# Altium footprint library Custom_Library.PcbLib: 221 footprints (part 12 of 14)
Each footprint in its own frame and in the unit in brackets; x right, y up, seen from the top. Pads: shape width x height; smd on the part's side, far side on the other; paste and mask are expansions set on the pad; w line width, h text height; cw(c..) or ccw(c..) is an arc to the next point about the centre after c.
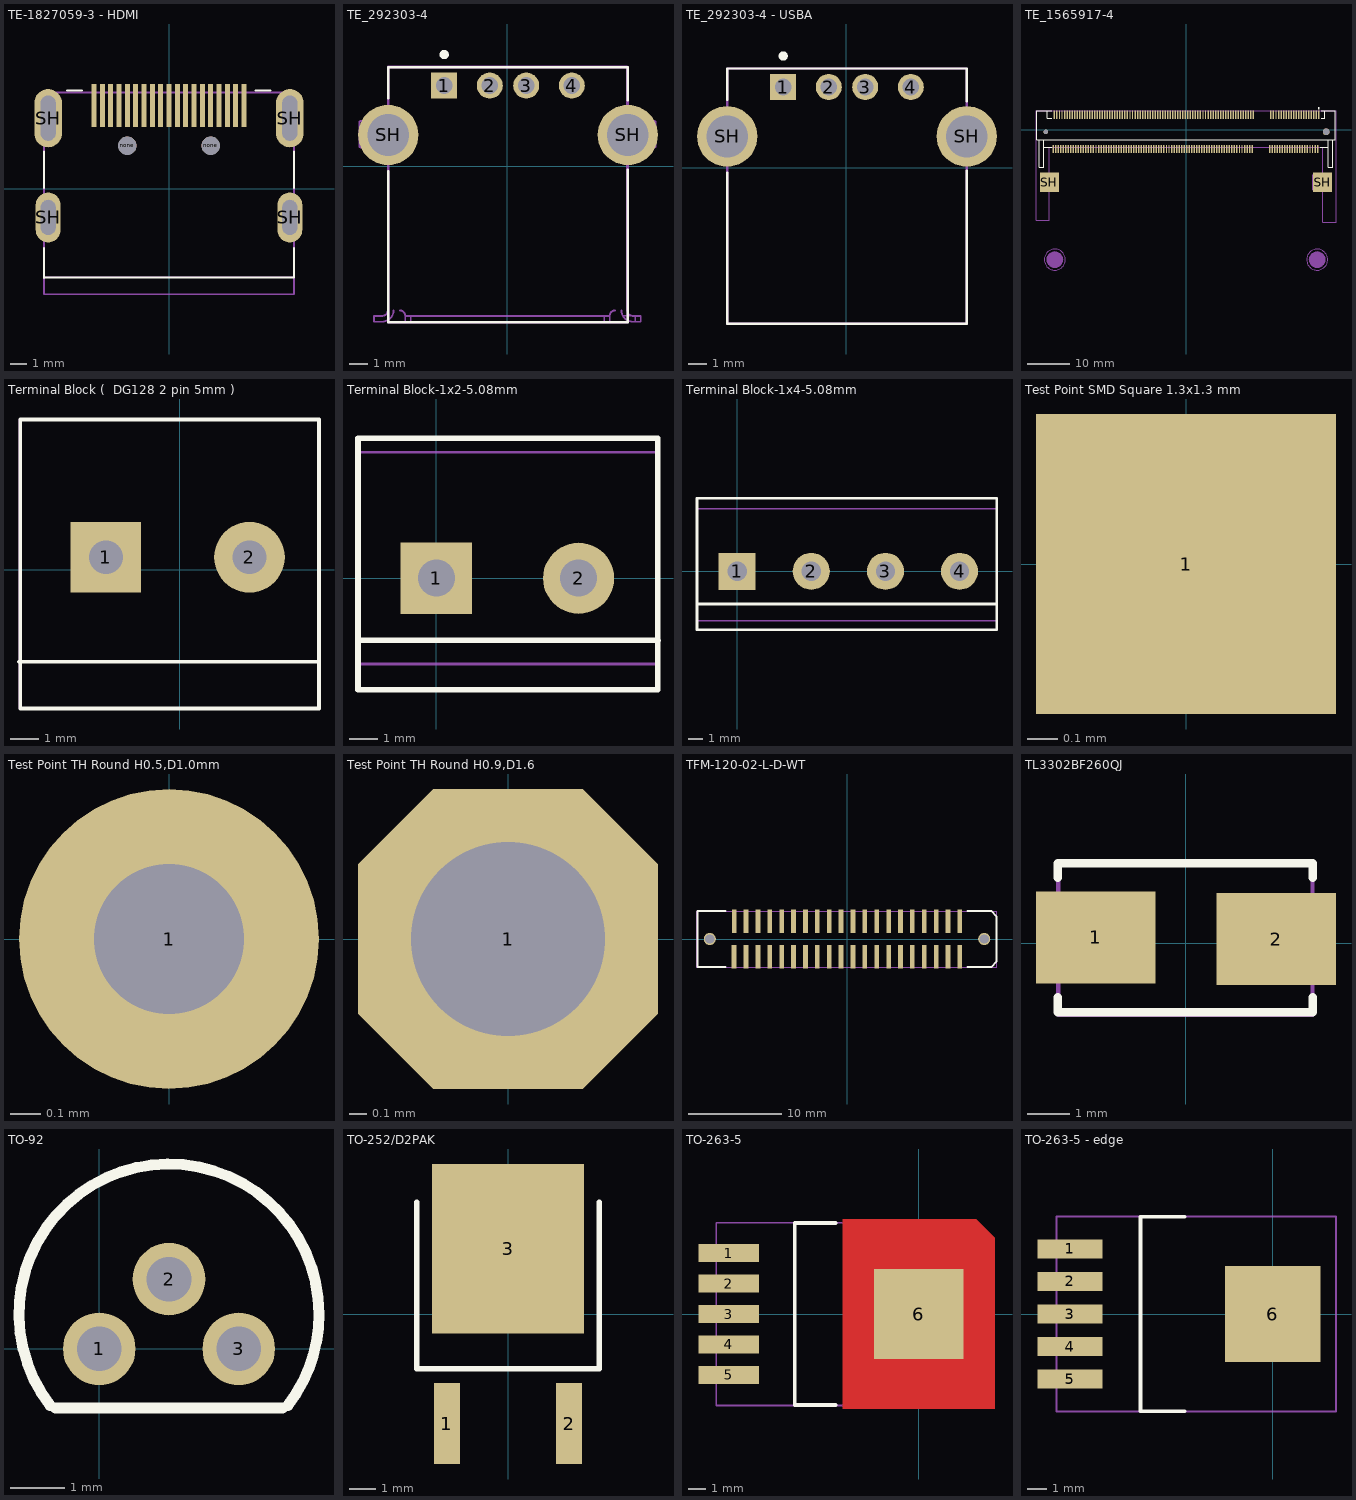
[diagram p11: the footprints below, top view; thin cyan lines are the x and y axes]

## TE-1827059-3 - HDMI [mm]
pads (25):
  rect 0.3x2.6 smd: 1(4.5,5) 2(4,5) 3(3.5,5) 4(3,5) 5(2.5,5) 6(2,5) 7(1.5,5) 8(1,5) 9(0.5,5) 10(0,5) 11(-0.5,5) 12(-1,5) 13(-1.5,5) 14(-2,5) 15(-2.5,5) 16(-3,5) 17(-3.5,5) 18(-4,5) 19(-4.5,5)
  round 1.1 hole 1.1 unplated: none(-2.5,2.59) none(2.5,2.59)
  oval 1.5x3 hole 0.9 slot 2.1 at 90 deg: SH(-7.25,-1.72) SH(7.25,-1.72)
  oval 1.65x3.5 hole 0.9 slot 2.7 at 90 deg: SH(-7.25,4.24) SH(7.25,4.24)
Top Overlay:
  lines w0.127: -7.5,-5.334 -7.5,-3.55 ; -7.5,0.05 -7.5,2.25 ; -7.493,-5.334 7.493,-5.31 ; -6.122,5.9 -5.222,5.9 ; 5.191,5.9 6.091,5.9 ; 7.5,-5.31 7.5,-3.55 ; 7.5,0.05 7.5,2.25
Top Assembly:
  lines w0.1: -7.5,-5.31 7.5,-5.31 ; -7.5,-5.31 -7.5,2.25 -7.5,5.776 5.066,5.776 7.5,5.776 7.5,-5.31 ; -7.5,-5.31 -7.5,-6.322 0.31,-6.322 7.5,-6.322 7.5,-5.31
  text "'.Designator'" at -3.49,-8.17 h1.27
3D body "1827059-3.STEP": height 6.08, standoff -2.2, extent -7.504,-6.321 7.497,5.779

## TE_292303-4 [mm]
pads (6):
  rect 1.428x1.428 hole 0.92: 1(-3.461,4.43)
  round 1.428 hole 0.92: 2(-0.961,4.43) 3(1.039,4.43) 4(3.539,4.43)
  round 3.316 hole 2.3: SH(-6.531,1.72) SH(6.609,1.72)
Top Overlay:
  circle w0.3: c-3.461,6.13 r0.1
  lines w0.127: -6.526,-0.27 -6.526,-8.56 6.604,-8.56 6.604,-0.17 ; -6.526,3.73 -6.526,5.44 6.604,5.44 6.604,3.63
Top Assembly:
  drawing of 5157 lines, arcs and shapes, not listed
  text "'.Designator'" at -3.765,-9.92 h1.27
Mechanical 13:
  lines w0.127: -6.526,-8.56 -6.526,5.44 6.604,5.44 6.604,-8.56 -6.526,-8.56
3D body "292303-4.STEP": height 7.77, standoff -3.59, extent -8.078,-8.56 8.156,5.44

## TE_292303-4 - USBA [mm]
pads (6):
  rect 1.428x1.428 hole 0.92: 1(-3.461,4.43)
  round 1.428 hole 0.92: 2(-0.961,4.43) 3(1.039,4.43) 4(3.539,4.43)
  round 3.316 hole 2.3: SH(-6.531,1.72) SH(6.609,1.72)
Top Overlay:
  circle w0.3: c-3.461,6.13 r0.1
  lines w0.127: -6.526,-0.27 -6.526,-8.56 6.604,-8.56 6.604,-0.17 ; -6.526,3.73 -6.526,5.44 6.604,5.44 6.604,3.63
Top Assembly:
  lines w0.1: -6.526,-8.56 6.604,-8.56 6.604,5.44 -6.526,5.44 -6.526,-8.56
  text "'.Designator'" at -3.765,-9.92 h1.27
Mechanical 13:
  lines w0.127: -6.526,-8.56 6.604,-8.56 6.604,5.44 -6.526,5.44 -6.526,-8.56
3D body "292303-4.STEP": height 7.77, standoff -3.59, extent -8.078,-8.56 8.156,5.44

## TE_1565917-4 [mm]
pads (206):
  rect 0.35x2 smd: 1(31.65,3.588) 2(31.35,-4.612) 3(31.05,3.588) 4(30.75,-4.612) 5(30.45,3.588) 6(30.15,-4.612) 7(29.85,3.588) 8(29.55,-4.612) 9(29.25,3.588) 10(28.95,-4.612) 11(28.65,3.588) 12(28.35,-4.612) 13(28.05,3.588) 14(27.75,-4.612) 15(27.45,3.588) 16(27.15,-4.612) 17(26.85,3.588) 18(26.55,-4.612) 19(26.25,3.588) 20(25.95,-4.612) 21(25.65,3.588) 22(25.35,-4.612) 23(25.05,3.588) 24(24.75,-4.612) 25(24.45,3.588) 26(24.15,-4.612) 27(23.85,3.588) 28(23.55,-4.612) 29(23.25,3.588) 30(22.95,-4.612) 31(22.65,3.588) 32(22.35,-4.612) 33(22.05,3.588) 34(21.75,-4.612) 35(21.45,3.588) 36(21.15,-4.612) 37(20.85,3.588) 38(20.55,-4.612) 39(20.25,3.588) 40(19.95,-4.612) 41(16.05,3.588) 42(15.75,-4.612) 43(15.45,3.588) 44(15.15,-4.612) 45(14.85,3.588) 46(14.55,-4.612) 47(14.25,3.588) 48(13.95,-4.612) 49(13.65,3.588) 50(13.35,-4.612) 51(13.05,3.588) 52(12.75,-4.612) 53(12.45,3.588) 54(12.15,-4.612) 55(11.85,3.588) 56(11.55,-4.612) 57(11.25,3.588) 58(10.95,-4.612) 59(10.65,3.588) 60(10.35,-4.612) 61(10.05,3.588) 62(9.75,-4.612) 63(9.45,3.588) 64(9.15,-4.612) 65(8.85,3.588) 66(8.55,-4.612) 67(8.25,3.588) 68(7.95,-4.612) 69(7.65,3.588) 70(7.35,-4.612) 71(7.05,3.588) 72(6.75,-4.612) 73(6.45,3.588) 74(6.15,-4.612) 75(5.85,3.588) 76(5.55,-4.612) 77(5.25,3.588) 78(4.95,-4.612) 79(4.65,3.588) 80(4.35,-4.612) 81(4.05,3.588) 82(3.75,-4.612) 83(3.45,3.588) 84(3.15,-4.612) 85(2.85,3.588) 86(2.55,-4.612) 87(2.25,3.588) 88(1.95,-4.612) 89(1.65,3.588) 90(1.35,-4.612) 91(1.05,3.588) 92(0.75,-4.612) 93(0.45,3.588) 94(0.15,-4.612) 95(-0.15,3.588) 96(-0.45,-4.612) 97(-0.75,3.588) 98(-1.05,-4.612) 99(-1.35,3.588) 100(-1.65,-4.612) 101(-1.95,3.588) 102(-2.25,-4.612) 103(-2.55,3.588) 104(-2.85,-4.612) 105(-3.15,3.588) 106(-3.45,-4.612) 107(-3.75,3.588) 108(-4.05,-4.612) 109(-4.35,3.588) 110(-4.65,-4.612) 111(-4.95,3.588) 112(-5.25,-4.612) 113(-5.55,3.588) 114(-5.85,-4.612) 115(-6.15,3.588) 116(-6.45,-4.612) 117(-6.75,3.588) 118(-7.05,-4.612) 119(-7.35,3.588) 120(-7.65,-4.612) 121(-7.95,3.588) 122(-8.25,-4.612) 123(-8.55,3.588) 124(-8.85,-4.612) 125(-9.15,3.588) 126(-9.45,-4.612) 127(-9.75,3.588) 128(-10.05,-4.612) 129(-10.35,3.588) 130(-10.65,-4.612) 131(-10.95,3.588) 132(-11.25,-4.612) 133(-11.55,3.588) 134(-11.85,-4.612) 135(-12.15,3.588) 136(-12.45,-4.612) 137(-12.75,3.588) 138(-13.05,-4.612) 139(-13.35,3.588) 140(-13.65,-4.612) 141(-13.95,3.588) 142(-14.25,-4.612) 143(-14.55,3.588) 144(-14.85,-4.612) 145(-15.15,3.588) 146(-15.45,-4.612) 147(-15.75,3.588) 148(-16.05,-4.612) 149(-16.35,3.588) 150(-16.65,-4.612) 151(-16.95,3.588) 152(-17.25,-4.612) 153(-17.55,3.588) 154(-17.85,-4.612) 155(-18.15,3.588) 156(-18.45,-4.612) 157(-18.75,3.588) 158(-19.05,-4.612) 159(-19.35,3.588) 160(-19.65,-4.612) 161(-19.95,3.588) 162(-20.25,-4.612) 163(-20.55,3.588) 164(-20.85,-4.612) 165(-21.15,3.588) 166(-21.45,-4.612) 167(-21.75,3.588) 168(-22.05,-4.612) 169(-22.35,3.588) 170(-22.65,-4.612) 171(-22.95,3.588) 172(-23.25,-4.612) 173(-23.55,3.588) 174(-23.85,-4.612) 175(-24.15,3.588) 176(-24.45,-4.612) 177(-24.75,3.588) 178(-25.05,-4.612) 179(-25.35,3.588) 180(-25.65,-4.612) 181(-25.95,3.588) 182(-26.25,-4.612) 183(-26.55,3.588) 184(-26.85,-4.612) 185(-27.15,3.588) 186(-27.45,-4.612) 187(-27.75,3.588) 188(-28.05,-4.612) 189(-28.35,3.588) 190(-28.65,-4.612) 191(-28.95,3.588) 192(-29.25,-4.612) 193(-29.55,3.588) 194(-29.85,-4.612) 195(-30.15,3.588) 196(-30.45,-4.612) 197(-30.75,3.588) 198(-31.05,-4.612) 199(-31.35,3.588) 200(-31.65,-4.612)
  round 4.013 on Mech7: none(-31.26,-30.966) none(31.261,-30.966)
  rect 4.5x4.6 smd: SH(-32.55,-12.512) SH(32.55,-12.512)
  round 1.1 hole 1.1 unplated: ""(-33.4,-0.512)
  round 1.6 hole 1.6 unplated: ""(33.4,-0.512)
Top Overlay:
  circle w0.25: c31.636,5.096 r0.1
  lines w0.127: -33,4.488 -32,4.488 ; -32,-4.212 -33.95,-4.212 ; -32,2.758 -33.02,2.758 -33.02,4.488 -35.55,4.488 -35.55,-2.362 -35,-2.362 ; 32,-4.212 33.95,-4.212 ; 32.2,2.758 33.02,2.758 33.02,4.488 35.55,4.488 35.55,-2.362 35,-2.362 ; 32.2,4.488 33,4.488 ; -35,-2.362 -33.95,-2.362 ; -35,-2.362 -35,-8.962 -33.95,-8.962 -33.95,-4.212 ; -33.95,-4.212 -33.95,-2.362 ; -33.95,-2.362 33.95,-2.362 ; 33.95,-2.362 35,-2.362 ; 33.95,-2.362 33.95,-8.962 35,-8.962 35,-2.362
Top Assembly:
  lines w0.1: -32.6,-14.32 -30.274,-14.32 -30.274,-10.68 -32.6,-10.68 ; 32.59,-14.32 30.263,-14.32 30.263,-10.68 32.59,-10.68 ; 35.75,-12.518 35.75,-12.5 ; -35.75,-21.56 -35.75,-16.962 -35.75,4.488 35.352,4.488 35.75,4.488 35.75,-22.012 33.8,-22.012 32.6,-22.012 32.6,-19.851 32.6,-4.212 -32.6,-4.212 -32.6,-17.97 -32.6,-21.56 -32.71,-21.56 -35.75,-21.56
  text "'.Designator'" at -3.37,-0.672 h1.27
DXF:
  circle w0.013: c-31.26,-30.966 r2.5
  circle w0.013: c31.261,-30.966 r2.5
3D body "Sodimm200.STEP": height 5.25, standoff -0.65, extent -35.755,-21.562 35.745,4.488

## Terminal Block (  DG128 2 pin 5mm ) [mm]
height 1.2
pads (2):
  rect 2.5x2.5 hole 1.2: 1(-2.615,0.447)
  round 2.5 hole 1.2: 2(2.465,0.447)
Top Overlay:
  lines w0.127: -5.685,-3.243 4.904,-3.243 ; -5.64,-4.901 4.923,-4.901 4.923,5.318 -5.64,5.318 -5.64,-4.901
Top Assembly:
  lines w0.1: -5.645,-4.903 4.915,-4.903 4.915,5.317 -5.645,5.317 -5.645,-4.903
  text "'.Designator'" at -3.556,-2.667 h1.27
3D body "DG128-5.0-02.stp": height 14.4, standoff -3.2, extent -5.695,-4.94 4.905,5.26

## Terminal Block-1x2-5.08mm [mil]
height 0.51
pads (2):
  rect 100x100 hole 52: 1(0,0)
  round 100 hole 52: 2(200,0)
Top Overlay:
  lines w7.87: -108.18,-87.09 311.61,-87.54 ; -110.06,-157 311.52,-157 311.52,197 -110.06,197 -110.06,-157
Top Assembly:
  lines w3.94: -108.28,-120.64 -108.28,177.17 310.33,177.17 310.33,-120.64 -108.28,-120.64
  text "'.Designator'" at -38.27,93.82 h50
3D body "tb5p-2p_p5_l10_w7-6_h10.stp": height 398.03, standoff -157.09, extent -107.83,-123.14 309.49,176.07

## Terminal Block-1x4-5.08mm [mil]
height 0.51
pads (4):
  rect 100x100 hole 52: 1(0,0)
  round 100 hole 52: 2(200,0) 3(400,0) 4(600,0)
Top Overlay:
  lines w7.87: -107.99,-87.89 700.35,-87.89 ; -107.99,-157.6 700.35,-157.6 700.35,197 -107.99,197 -107.99,-157.6
Top Assembly:
  lines w3.94: -108.2,-133.86 701.01,-133.86 701.01,169.29 -108.2,169.29 -108.2,-133.86
  text "'.Designator'" at 162.41,96.36 h50
3D body "tb5p-2p_p5_l10_w7-6_h10.stp": height 398.03, standoff -157.09, extent 284.15,-133 701.47,166.21
3D body "tb5p-2p_p5_l10_w7-6_h10.stp": height 398.03, standoff -157.09, extent -108.53,-133 308.79,166.21

## Test Point SMD Square 1.3x1.3 mm [mm]
pads (1):
  rect 1x1 smd paste-1 mask+0.1: 1(0,0)

## Test Point TH Round H0.5,D1.0mm [mm]
pads (1):
  round 1 hole 0.5: 1(0,0)

## Test Point TH Round H0.9,D1.6 [mm]
pads (1):
  oct 1.7x1.7 hole 1.1: 1(0,0)

## TFM-120-02-L-D-WT [mm]
pads (42):
  rect 0.55x2.5 smd: 1(-12.065,-1.905)
  rect 0.5x2.5 smd: 2(-12.065,1.905) 3(-10.795,-1.905) 4(-10.795,1.905) 5(-9.525,-1.905) 6(-9.525,1.905) 7(-8.255,-1.905) 8(-8.255,1.905) 9(-6.985,-1.905) 10(-6.985,1.905) 11(-5.715,-1.905) 12(-5.715,1.905) 13(-4.445,-1.905) 14(-4.445,1.905) 15(-3.175,-1.905) 16(-3.175,1.905) 17(-1.905,-1.905) 18(-1.905,1.905) 19(-0.635,-1.905) 20(-0.635,1.905) 21(0.635,-1.905) 22(0.635,1.905) 23(1.905,-1.905) 24(1.905,1.905) 25(3.175,-1.905) 26(3.175,1.905) 27(4.445,-1.905) 28(4.445,1.905) 29(5.715,-1.905) 30(5.715,1.905) 31(6.985,-1.905) 32(6.985,1.905) 33(8.255,-1.905) 34(8.255,1.905) 35(9.525,-1.905) 36(9.525,1.905) 37(10.795,-1.905) 38(10.795,1.905) 39(12.065,-1.905) 40(12.065,1.905)
  round 1.3 hole 1: none(-14.665,-0.005) none(14.665,-0.005)
Top Overlay:
  lines w0.2: -13,-3 -16,-3 -16,3 -13,3 ; 12.9,-3 15.4,-3 16,-2.4 16,2.4 15.4,3 12.9,3
Top Assembly:
  lines w0.1: -16.039,-3 -16.039,2.953 13.456,2.953 16.035,2.953 16.035,-3 -16.039,-3
  text "'.Designator'" at -4.556,-0.451 h1.27
3D body "TFM-120-02-L-D-WT.stp": height 5.74, standoff -2.21, extent -16.042,-2.996 16.038,2.973

## TL3302BF260QJ [mm]
pads (2):
  rect 2.8x2.16 smd mask+0.102: 1(-2.12,0.14) 2(2.12,0.1)
Top Overlay:
  lines w0.2: -3.007,-1.265 -3.007,-1.615 2.97,-1.615 2.97,-1.265 ; -3.007,1.536 -3.007,1.886 2.97,1.886 2.97,1.536
Top Assembly:
  lines w0.1: -3,-1.68 -3,1.86 2.97,1.86 2.97,-1.68 -3,-1.68
  text "'.Designator'" at -3.26,-2.79 h1.27
3D body "asdasd.STEP": height 5.2, standoff 0, extent -3.38,-1.651 3.38,1.849

## TO-92 [mil]
pads (3):
  round 52 hole 32: 1(0,0) 2(50,50) 3(100,0)
Top Overlay:
  lines w7.87: -35.2,-40.55 cw(c50,25) 157.5,25 cw(c50,25) 135.2,-40.55 ; -31.24,-42.5 131.24,-42.5

## TO-252/D2PAK [mm]
pads (3):
  rect 0.97x3.02 smd mask+0.152: 1(-2.286,-4.09) 2(2.286,-4.09)
  rect 5.67x6.32 smd paste-4 mask+0.152: 3(0,2.44)
Top Overlay:
  lines w0.2: -3.4,4.176 -3.4,-2.044 3.4,-2.044 3.4,4.176
Top Paste:
  region: -0.55,3.87 -2.27,3.87 -2.27,5.23 -0.55,5.23
  region: -0.55,1.76 -2.27,1.76 -2.27,3.12 -0.55,3.12
  region: -0.55,-0.35 -2.27,-0.35 -2.27,1.01 -0.55,1.01
  region: 2.27,3.87 0.55,3.87 0.55,5.23 2.27,5.23
  region: 2.27,1.76 0.55,1.76 0.55,3.12 2.27,3.12
  region: 2.27,-0.35 0.55,-0.35 0.55,1.01 2.27,1.01
3D body "VS-12CWQ10FN-M3.stp": height 2.49, standoff 0.05, extent -3.366,-5.202 3.366,6.482

## TO-263-5 [mm]
pads (6):
  rect 3.4x1 smd paste-3 mask+0: 1(-10.6,3.4) 2(-10.6,1.7) 3(-10.6,0) 4(-10.6,-1.7) 5(-10.6,-3.4)
  rect 5x5 smd paste-6 mask+0: 6(0,0)
Top Layer:
  region: -4.249,5.3 3.201,5.3 4.251,4.25 4.251,-5.3 -4.249,-5.3
Top Overlay:
  lines w0.2: -4.62,-5.08 -6.905,-5.08 -6.905,5.08 -4.62,5.08
Top Paste:
  region: 4.25,-5.3 -4.25,-5.3 -4.25,5.3 3.2,5.3 4.25,4.25
  region: -8.95,-0.45 -12.25,-0.45 -12.25,0.45 -8.95,0.45
  region: -8.95,1.25 -12.25,1.25 -12.25,2.15 -8.95,2.15
  region: -8.95,2.95 -12.25,2.95 -12.25,3.85 -8.95,3.85
  region: -8.95,-2.15 -12.25,-2.15 -12.25,-1.25 -8.95,-1.25
  region: -8.95,-3.85 -12.25,-3.85 -12.25,-2.95 -8.95,-2.95
Top Solder:
  region: -8.83,-0.57 -12.37,-0.57 -12.37,0.57 -8.83,0.57
  region: -8.83,1.13 -12.37,1.13 -12.37,2.27 -8.83,2.27
  region: -8.83,2.83 -12.37,2.83 -12.37,3.97 -8.83,3.97
  region: -8.83,-2.27 -12.37,-2.27 -12.37,-1.13 -8.83,-1.13
  region: -8.83,-3.97 -12.37,-3.97 -12.37,-2.83 -8.83,-2.83
  region: 4.37,-5.42 -4.37,-5.42 -4.37,5.42 3.265,5.42 4.37,4.315
Top Assembly:
  lines w0.1: -11.3,-5.1 3.3,-5.1 3.3,5.1 3.3,5.095 -11.3,5.095 -11.3,-5.1
  text "'.Designator'" at -7.465,6.185 h1.27
3D body "NOPB.STEP": height 4.8, standoff 0, extent -11.249,-5.076 3.102,5.084

## TO-263-5 - edge [mm]
pads (6):
  rect 3.4x1 smd paste-3 mask+0: 1(-10.6,3.4) 2(-10.6,1.7) 3(-10.6,0) 4(-10.6,-1.7) 5(-10.6,-3.4)
  rect 5x5 smd paste-6 mask+0: 6(0,0)
Top Overlay:
  lines w0.2: -4.62,-5.08 -6.905,-5.08 -6.905,5.08 -4.62,5.08
Top Paste:
  region: -8.95,-3.85 -12.25,-3.85 -12.25,-2.95 -8.95,-2.95
  region: -8.95,-2.15 -12.25,-2.15 -12.25,-1.25 -8.95,-1.25
  region: -8.95,2.95 -12.25,2.95 -12.25,3.85 -8.95,3.85
  region: -8.95,1.25 -12.25,1.25 -12.25,2.15 -8.95,2.15
  region: -8.95,-0.45 -12.25,-0.45 -12.25,0.45 -8.95,0.45
Top Solder:
  region: -8.83,-3.97 -12.37,-3.97 -12.37,-2.83 -8.83,-2.83
  region: -8.83,-2.27 -12.37,-2.27 -12.37,-1.13 -8.83,-1.13
  region: -8.83,2.83 -12.37,2.83 -12.37,3.97 -8.83,3.97
  region: -8.83,1.13 -12.37,1.13 -12.37,2.27 -8.83,2.27
  region: -8.83,-0.57 -12.37,-0.57 -12.37,0.57 -8.83,0.57
Top Assembly:
  lines w0.1: -11.3,-5.1 -11.3,5.095 3.3,5.095 3.3,5.1 3.3,-5.1 -11.3,-5.1
  text "'.Designator'" at -7.465,6.185 h1.27
3D body "NOPB.STEP": height 4.8, standoff 0, extent -11.249,-5.076 3.102,5.084